# Altium schematic symbol library jlcpcb_2025_04_resistors_extended_0201.schlib: 1508 symbols (part 1 of 8) (continued)
## 0201WMF2672TCE
designator R?  Resistance: 26.7kΩ  (hidden comment: *)
Resistor, 26.7kΩ, ±1%, 50mW, 25V, ±200ppm/℃, -55℃~+155℃, SMD 0201; Manufacturer: Uniroyal; Manufacturer Part Number: 0201WMF2672TCE; Supplier 1: LCSC; Supplier Part Number 1: C270764; JLCPCB Part Number: C270764; Power Rating: 50mW; Category: Resistors; Package Size: 0201; JLCPCB Basic Part: Yes; Tolerance: ±1%; Voltage Rating: 25V; Temperature Coefficient: ±200ppm/℃; Temperature Rating: -55℃~+155℃; ComponentLink1Description: Datasheet; ComponentLink1URL: https://wmsc.lcsc.com/wmsc/upload/file/pdf/v2/lcsc/2205311945_UNI-ROYAL-Uniroyal-Elec-0201WMF2672TCE_C270764.pdf; ComponentLink2Description: JLCPCB Part URL; ComponentLink2URL: https://jlcpcb.com/partdetail/C270764
pins: 1, 2
1 alternate drawing of the same symbol

## 0201WMF2673TEE
designator R?  Resistance: 267000Ω  (hidden comment: *)
Resistor, 267000Ω, ±1%, 50mW, 25V, ±200ppm/℃, -55℃~+155℃, SMD 0201; Manufacturer: Uniroyal; Manufacturer Part Number: 0201WMF2673TEE; Supplier 1: LCSC; Supplier Part Number 1: C423627; JLCPCB Part Number: C423627; Power Rating: 50mW; Category: Resistors; Package Size: 0201; JLCPCB Basic Part: Yes; Tolerance: ±1%; Voltage Rating: 25V; Temperature Coefficient: ±200ppm/℃; Temperature Rating: -55℃~+155℃; ComponentLink1Description: Datasheet; ComponentLink1URL: https://wmsc.lcsc.com/wmsc/upload/file/pdf/v2/lcsc/2205312145_UNI-ROYAL-Uniroyal-Elec-0201WMF2673TEE_C423627.pdf; ComponentLink2Description: JLCPCB Part URL; ComponentLink2URL: https://jlcpcb.com/partdetail/C423627
pins: 1, 2
1 alternate drawing of the same symbol

## 0201WMF2700TEE
designator R?  Resistance: 270Ω  (hidden comment: *)
Resistor, 270Ω, ±1%, 50mW, 25V, ±200ppm/℃, -55℃~+155℃, SMD 0201; Manufacturer: Uniroyal; Manufacturer Part Number: 0201WMF2700TEE; Supplier 1: LCSC; Supplier Part Number 1: C423625; JLCPCB Part Number: C423625; Power Rating: 50mW; Category: Resistors; Package Size: 0201; JLCPCB Basic Part: Yes; Tolerance: ±1%; Voltage Rating: 25V; Temperature Coefficient: ±200ppm/℃; Temperature Rating: -55℃~+155℃; ComponentLink1Description: Datasheet; ComponentLink1URL: https://wmsc.lcsc.com/wmsc/upload/file/pdf/v2/lcsc/2205312030_UNI-ROYAL-Uniroyal-Elec-0201WMF2700TEE_C423625.pdf; ComponentLink2Description: JLCPCB Part URL; ComponentLink2URL: https://jlcpcb.com/partdetail/C423625
pins: 1, 2
1 alternate drawing of the same symbol

## 0201WMF2701TEE
designator R?  Resistance: 2700Ω  (hidden comment: *)
Resistor, 2700Ω, ±1%, 50mW, 25V, ±200ppm/℃, -55℃~+155℃, SMD 0201; Manufacturer: Uniroyal; Manufacturer Part Number: 0201WMF2701TEE; Supplier 1: LCSC; Supplier Part Number 1: C423624; JLCPCB Part Number: C423624; Power Rating: 50mW; Category: Resistors; Package Size: 0201; JLCPCB Basic Part: Yes; Tolerance: ±1%; Voltage Rating: 25V; Temperature Coefficient: ±200ppm/℃; Temperature Rating: -55℃~+155℃; ComponentLink1Description: Datasheet; ComponentLink1URL: https://wmsc.lcsc.com/wmsc/upload/file/pdf/v2/lcsc/2205312145_UNI-ROYAL-Uniroyal-Elec-0201WMF2701TEE_C423624.pdf; ComponentLink2Description: JLCPCB Part URL; ComponentLink2URL: https://jlcpcb.com/partdetail/C423624
pins: 1, 2
1 alternate drawing of the same symbol

## 0201WMF2702TEE
designator R?  Resistance: 27kΩ  (hidden comment: *)
Resistor, 27kΩ, ±1%, 50mW, 25V, ±200ppm/℃, -55℃~+155℃, SMD 0201; Manufacturer: Uniroyal; Manufacturer Part Number: 0201WMF2702TEE; Supplier 1: LCSC; Supplier Part Number 1: C270351; JLCPCB Part Number: C270351; Power Rating: 50mW; Category: Resistors; Package Size: 0201; JLCPCB Basic Part: Yes; Tolerance: ±1%; Voltage Rating: 25V; Temperature Coefficient: ±200ppm/℃; Temperature Rating: -55℃~+155℃; ComponentLink1Description: Datasheet; ComponentLink1URL: https://wmsc.lcsc.com/wmsc/upload/file/pdf/v2/lcsc/2205311945_UNI-ROYAL-Uniroyal-Elec-0201WMF2702TEE_C270351.pdf; ComponentLink2Description: JLCPCB Part URL; ComponentLink2URL: https://jlcpcb.com/partdetail/C270351
pins: 1, 2
1 alternate drawing of the same symbol

## 0201WMF2703TEE
designator R?  Resistance: 270kΩ  (hidden comment: *)
Resistor, 270kΩ, ±1%, 50mW, 25V, ±200ppm/℃, -55℃~+155℃, SMD 0201; Manufacturer: Uniroyal; Manufacturer Part Number: 0201WMF2703TEE; Supplier 1: LCSC; Supplier Part Number 1: C473608; JLCPCB Part Number: C473608; Power Rating: 50mW; Category: Resistors; Package Size: 0201; JLCPCB Basic Part: Yes; Tolerance: ±1%; Voltage Rating: 25V; Temperature Coefficient: ±200ppm/℃; Temperature Rating: -55℃~+155℃; ComponentLink1Description: Datasheet; ComponentLink1URL: https://wmsc.lcsc.com/wmsc/upload/file/pdf/v2/lcsc/2205312130_UNI-ROYAL-Uniroyal-Elec-0201WMF2703TEE_C473608.pdf; ComponentLink2Description: JLCPCB Part URL; ComponentLink2URL: https://jlcpcb.com/partdetail/C473608
pins: 1, 2
1 alternate drawing of the same symbol

## 0201WMF2742TEE
designator R?  Resistance: 27.4kΩ  (hidden comment: *)
Resistor, 27.4kΩ, ±1%, 50mW, 25V, ±200ppm/℃, -55℃~+155℃, SMD 0201; Manufacturer: Uniroyal; Manufacturer Part Number: 0201WMF2742TEE; Supplier 1: LCSC; Supplier Part Number 1: C473648; JLCPCB Part Number: C473648; Power Rating: 50mW; Category: Resistors; Package Size: 0201; JLCPCB Basic Part: Yes; Tolerance: ±1%; Voltage Rating: 25V; Temperature Coefficient: ±200ppm/℃; Temperature Rating: -55℃~+155℃; ComponentLink1Description: Datasheet; ComponentLink1URL: https://wmsc.lcsc.com/wmsc/upload/file/pdf/v2/lcsc/2205312130_UNI-ROYAL-Uniroyal-Elec-0201WMF2742TEE_C473648.pdf; ComponentLink2Description: JLCPCB Part URL; ComponentLink2URL: https://jlcpcb.com/partdetail/C473648
pins: 1, 2
1 alternate drawing of the same symbol

## 0201WMF2743TEE
designator R?  Resistance: 274000Ω  (hidden comment: *)
Resistor, 274000Ω, ±1%, 50mW, 25V, ±200ppm/℃, -55℃~+155℃, SMD 0201; Manufacturer: Uniroyal; Manufacturer Part Number: 0201WMF2743TEE; Supplier 1: LCSC; Supplier Part Number 1: C423622; JLCPCB Part Number: C423622; Power Rating: 50mW; Category: Resistors; Package Size: 0201; JLCPCB Basic Part: Yes; Tolerance: ±1%; Voltage Rating: 25V; Temperature Coefficient: ±200ppm/℃; Temperature Rating: -55℃~+155℃; ComponentLink1Description: Datasheet; ComponentLink1URL: https://wmsc.lcsc.com/wmsc/upload/file/pdf/v2/lcsc/2205312145_UNI-ROYAL-Uniroyal-Elec-0201WMF2743TEE_C423622.pdf; ComponentLink2Description: JLCPCB Part URL; ComponentLink2URL: https://jlcpcb.com/partdetail/C423622
pins: 1, 2
1 alternate drawing of the same symbol

## 0201WMF2802TEE
designator R?  Resistance: 28kΩ  (hidden comment: *)
Resistor, 28kΩ, ±1%, 50mW, 25V, ±200ppm/℃, -55℃~+155℃, SMD 0201; Manufacturer: Uniroyal; Manufacturer Part Number: 0201WMF2802TEE; Supplier 1: LCSC; Supplier Part Number 1: C473489; JLCPCB Part Number: C473489; Power Rating: 50mW; Category: Resistors; Package Size: 0201; JLCPCB Basic Part: Yes; Tolerance: ±1%; Voltage Rating: 25V; Temperature Coefficient: ±200ppm/℃; Temperature Rating: -55℃~+155℃; ComponentLink1Description: Datasheet; ComponentLink1URL: https://wmsc.lcsc.com/wmsc/upload/file/pdf/v2/lcsc/2205312145_UNI-ROYAL-Uniroyal-Elec-0201WMF2802TEE_C473489.pdf; ComponentLink2Description: JLCPCB Part URL; ComponentLink2URL: https://jlcpcb.com/partdetail/C473489
pins: 1, 2
1 alternate drawing of the same symbol

## 0201WMF2871TEE
designator R?  Resistance: 2870Ω  (hidden comment: *)
Resistor, 2870Ω, ±1%, 50mW, 25V, ±200ppm/℃, -55℃~+155℃, SMD 0201; Manufacturer: Uniroyal; Manufacturer Part Number: 0201WMF2871TEE; Supplier 1: LCSC; Supplier Part Number 1: C423613; JLCPCB Part Number: C423613; Power Rating: 50mW; Category: Resistors; Package Size: 0201; JLCPCB Basic Part: Yes; Tolerance: ±1%; Voltage Rating: 25V; Temperature Coefficient: ±200ppm/℃; Temperature Rating: -55℃~+155℃; ComponentLink1Description: Datasheet; ComponentLink1URL: https://wmsc.lcsc.com/wmsc/upload/file/pdf/v2/lcsc/2205312145_UNI-ROYAL-Uniroyal-Elec-0201WMF2871TEE_C423613.pdf; ComponentLink2Description: JLCPCB Part URL; ComponentLink2URL: https://jlcpcb.com/partdetail/C423613
pins: 1, 2
1 alternate drawing of the same symbol

## 0201WMF2873TCE
designator R?  Resistance: 287kΩ  (hidden comment: *)
Resistor, 287kΩ, ±1%, 50mW, 25V, ±200ppm/℃, -55℃~+155℃, SMD 0201; Manufacturer: Uniroyal; Manufacturer Part Number: 0201WMF2873TCE; Supplier 1: LCSC; Supplier Part Number 1: C270758; JLCPCB Part Number: C270758; Power Rating: 50mW; Category: Resistors; Package Size: 0201; JLCPCB Basic Part: Yes; Tolerance: ±1%; Voltage Rating: 25V; Temperature Coefficient: ±200ppm/℃; Temperature Rating: -55℃~+155℃; ComponentLink1Description: Datasheet; ComponentLink1URL: https://wmsc.lcsc.com/wmsc/upload/file/pdf/v2/lcsc/2205311945_UNI-ROYAL-Uniroyal-Elec-0201WMF2873TCE_C270758.pdf; ComponentLink2Description: JLCPCB Part URL; ComponentLink2URL: https://jlcpcb.com/partdetail/C270758
pins: 1, 2
1 alternate drawing of the same symbol

## 0201WMF2941TCE
designator R?  Resistance: 2.94kΩ  (hidden comment: *)
Resistor, 2.94kΩ, ±1%, 50mW, 25V, ±200ppm/℃, -55℃~+155℃, SMD 0201; Manufacturer: Uniroyal; Manufacturer Part Number: 0201WMF2941TCE; Supplier 1: LCSC; Supplier Part Number 1: C270757; JLCPCB Part Number: C270757; Power Rating: 50mW; Category: Resistors; Package Size: 0201; JLCPCB Basic Part: Yes; Tolerance: ±1%; Voltage Rating: 25V; Temperature Coefficient: ±200ppm/℃; Temperature Rating: -55℃~+155℃; ComponentLink1Description: Datasheet; ComponentLink1URL: https://wmsc.lcsc.com/wmsc/upload/file/pdf/v2/lcsc/2205311945_UNI-ROYAL-Uniroyal-Elec-0201WMF2941TCE_C270757.pdf; ComponentLink2Description: JLCPCB Part URL; ComponentLink2URL: https://jlcpcb.com/partdetail/C270757
pins: 1, 2
1 alternate drawing of the same symbol

## 0201WMF3001TEE
designator R?  Resistance: 3kΩ  (hidden comment: *)
Resistor, 3kΩ, ±1%, 50mW, 25V, ±200ppm/℃, -55℃~+155℃, SMD 0201; Manufacturer: Uniroyal; Manufacturer Part Number: 0201WMF3001TEE; Supplier 1: LCSC; Supplier Part Number 1: C473468; JLCPCB Part Number: C473468; Power Rating: 50mW; Category: Resistors; Package Size: 0201; JLCPCB Basic Part: Yes; Tolerance: ±1%; Voltage Rating: 25V; Temperature Coefficient: ±200ppm/℃; Temperature Rating: -55℃~+155℃; ComponentLink1Description: Datasheet; ComponentLink1URL: https://wmsc.lcsc.com/wmsc/upload/file/pdf/v2/lcsc/2205312145_UNI-ROYAL-Uniroyal-Elec-0201WMF3001TEE_C473468.pdf; ComponentLink2Description: JLCPCB Part URL; ComponentLink2URL: https://jlcpcb.com/partdetail/C473468
pins: 1, 2
1 alternate drawing of the same symbol

## 0201WMF3002TEE
designator R?  Resistance: 30kΩ  (hidden comment: *)
Resistor, 30kΩ, ±1%, 50mW, 25V, ±200ppm/℃, -55℃~+155℃, SMD 0201; Manufacturer: Uniroyal; Manufacturer Part Number: 0201WMF3002TEE; Supplier 1: LCSC; Supplier Part Number 1: C246933; JLCPCB Part Number: C246933; Power Rating: 50mW; Category: Resistors; Package Size: 0201; JLCPCB Basic Part: Yes; Tolerance: ±1%; Voltage Rating: 25V; Temperature Coefficient: ±200ppm/℃; Temperature Rating: -55℃~+155℃; ComponentLink1Description: Datasheet; ComponentLink1URL: https://wmsc.lcsc.com/wmsc/upload/file/pdf/v2/lcsc/2205311916_UNI-ROYAL-Uniroyal-Elec-0201WMF3002TEE_C246933.pdf; ComponentLink2Description: JLCPCB Part URL; ComponentLink2URL: https://jlcpcb.com/partdetail/C246933
pins: 1, 2
1 alternate drawing of the same symbol

## 0201WMF3003TEE
designator R?  Resistance: 300kΩ  (hidden comment: *)
Resistor, 300kΩ, ±1%, 50mW, 25V, ±200ppm/℃, -55℃~+155℃, SMD 0201; Manufacturer: Uniroyal; Manufacturer Part Number: 0201WMF3003TEE; Supplier 1: LCSC; Supplier Part Number 1: C473494; JLCPCB Part Number: C473494; Power Rating: 50mW; Category: Resistors; Package Size: 0201; JLCPCB Basic Part: Yes; Tolerance: ±1%; Voltage Rating: 25V; Temperature Coefficient: ±200ppm/℃; Temperature Rating: -55℃~+155℃; ComponentLink1Description: Datasheet; ComponentLink1URL: https://wmsc.lcsc.com/wmsc/upload/file/pdf/v2/lcsc/2205312030_UNI-ROYAL-Uniroyal-Elec-0201WMF3003TEE_C473494.pdf; ComponentLink2Description: JLCPCB Part URL; ComponentLink2URL: https://jlcpcb.com/partdetail/C473494
pins: 1, 2
1 alternate drawing of the same symbol

## 0201WMF3004TEE
designator R?  Resistance: 3MΩ  (hidden comment: *)
Resistor, 3MΩ, ±1%, 50mW, 25V, ±200ppm/℃, -55℃~+155℃, SMD 0201; Manufacturer: Uniroyal; Manufacturer Part Number: 0201WMF3004TEE; Supplier 1: LCSC; Supplier Part Number 1: C423601; JLCPCB Part Number: C423601; Power Rating: 50mW; Category: Resistors; Package Size: 0201; JLCPCB Basic Part: Yes; Tolerance: ±1%; Voltage Rating: 25V; Temperature Coefficient: ±200ppm/℃; Temperature Rating: -55℃~+155℃; ComponentLink1Description: Datasheet; ComponentLink1URL: https://wmsc.lcsc.com/wmsc/upload/file/pdf/v2/lcsc/2205312145_UNI-ROYAL-Uniroyal-Elec-0201WMF3004TEE_C423601.pdf; ComponentLink2Description: JLCPCB Part URL; ComponentLink2URL: https://jlcpcb.com/partdetail/C423601
pins: 1, 2
1 alternate drawing of the same symbol

## 0201WMF3010TEE
designator R?  Resistance: 301Ω  (hidden comment: *)
Resistor, 301Ω, ±1%, 50mW, 25V, ±200ppm/℃, -55℃~+155℃, SMD 0201; Manufacturer: Uniroyal; Manufacturer Part Number: 0201WMF3010TEE; Supplier 1: LCSC; Supplier Part Number 1: C473531; JLCPCB Part Number: C473531; Power Rating: 50mW; Category: Resistors; Package Size: 0201; JLCPCB Basic Part: Yes; Tolerance: ±1%; Voltage Rating: 25V; Temperature Coefficient: ±200ppm/℃; Temperature Rating: -55℃~+155℃; ComponentLink1Description: Datasheet; ComponentLink1URL: https://wmsc.lcsc.com/wmsc/upload/file/pdf/v2/lcsc/2205312145_UNI-ROYAL-Uniroyal-Elec-0201WMF3010TEE_C473531.pdf; ComponentLink2Description: JLCPCB Part URL; ComponentLink2URL: https://jlcpcb.com/partdetail/C473531
pins: 1, 2
1 alternate drawing of the same symbol

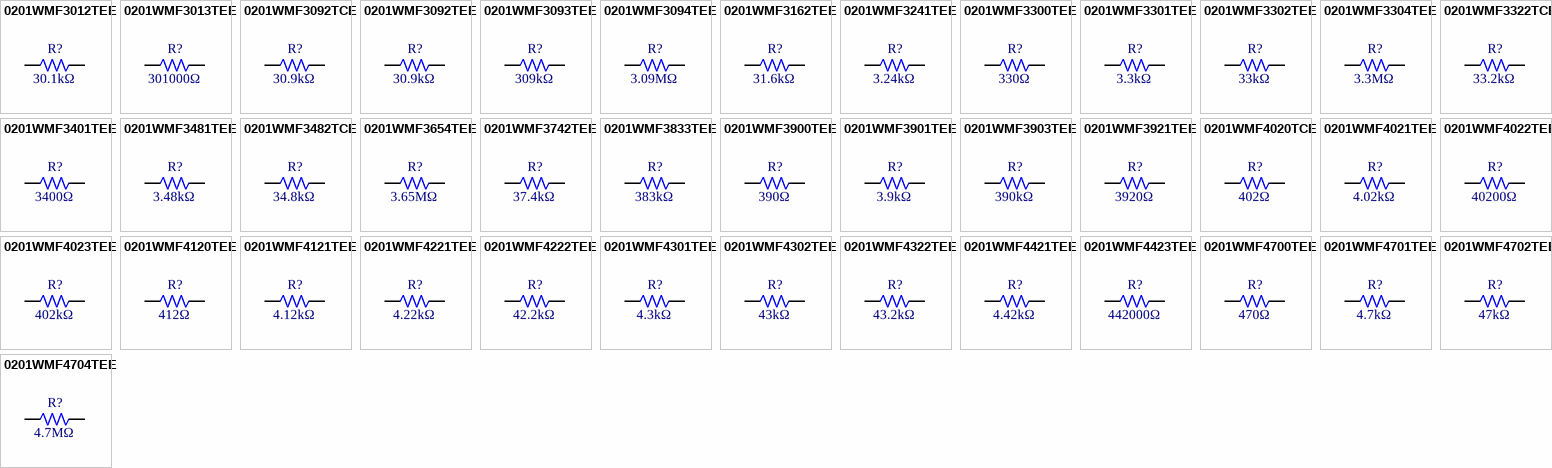
[diagram p4: symbols 0201WMF3012TEE to 0201WMF4704TEE]

## 0201WMF3012TEE
designator R?  Resistance: 30.1kΩ  (hidden comment: *)
Resistor, 30.1kΩ, ±1%, 50mW, 25V, ±200ppm/℃, -55℃~+155℃, SMD 0201; Manufacturer: Uniroyal; Manufacturer Part Number: 0201WMF3012TEE; Supplier 1: LCSC; Supplier Part Number 1: C778420; JLCPCB Part Number: C778420; Power Rating: 50mW; Category: Resistors; Package Size: 0201; JLCPCB Basic Part: Yes; Tolerance: ±1%; Voltage Rating: 25V; Temperature Coefficient: ±200ppm/℃; Temperature Rating: -55℃~+155℃; ComponentLink1Description: Datasheet; ComponentLink1URL: https://wmsc.lcsc.com/wmsc/upload/file/pdf/v2/lcsc/2205312045_UNI-ROYAL-Uniroyal-Elec-0201WMF3012TEE_C778420.pdf; ComponentLink2Description: JLCPCB Part URL; ComponentLink2URL: https://jlcpcb.com/partdetail/C778420
pins: 1, 2
1 alternate drawing of the same symbol

## 0201WMF3013TEE
designator R?  Resistance: 301000Ω  (hidden comment: *)
Resistor, 301000Ω, ±1%, 50mW, 25V, ±200ppm/℃, -55℃~+155℃, SMD 0201; Manufacturer: Uniroyal; Manufacturer Part Number: 0201WMF3013TEE; Supplier 1: LCSC; Supplier Part Number 1: C423598; JLCPCB Part Number: C423598; Power Rating: 50mW; Category: Resistors; Package Size: 0201; JLCPCB Basic Part: Yes; Tolerance: ±1%; Voltage Rating: 25V; Temperature Coefficient: ±200ppm/℃; Temperature Rating: -55℃~+155℃; ComponentLink1Description: Datasheet; ComponentLink1URL: https://wmsc.lcsc.com/wmsc/upload/file/pdf/v2/lcsc/2206011100_UNI-ROYAL-Uniroyal-Elec-0201WMF3013TEE_C423598.pdf; ComponentLink2Description: JLCPCB Part URL; ComponentLink2URL: https://jlcpcb.com/partdetail/C423598
pins: 1, 2
1 alternate drawing of the same symbol

## 0201WMF3092TCE
designator R?  Resistance: 30.9kΩ  (hidden comment: *)
Resistor, 30.9kΩ, ±1%, 50mW, 25V, ±200ppm/℃, -55℃~+155℃, SMD 0201; Manufacturer: Uniroyal; Manufacturer Part Number: 0201WMF3092TCE; Supplier 1: LCSC; Supplier Part Number 1: C270751; JLCPCB Part Number: C270751; Power Rating: 50mW; Category: Resistors; Package Size: 0201; JLCPCB Basic Part: Yes; Tolerance: ±1%; Voltage Rating: 25V; Temperature Coefficient: ±200ppm/℃; Temperature Rating: -55℃~+155℃; ComponentLink1Description: Datasheet; ComponentLink1URL: https://wmsc.lcsc.com/wmsc/upload/file/pdf/v2/lcsc/2205311945_UNI-ROYAL-Uniroyal-Elec-0201WMF3092TCE_C270751.pdf; ComponentLink2Description: JLCPCB Part URL; ComponentLink2URL: https://jlcpcb.com/partdetail/C270751
pins: 1, 2
1 alternate drawing of the same symbol

## 0201WMF3092TEE
designator R?  Resistance: 30.9kΩ  (hidden comment: *)
Resistor, 30.9kΩ, ±1%, 50mW, 25V, ±200ppm/℃, -55℃~+155℃, SMD 0201; Manufacturer: Uniroyal; Manufacturer Part Number: 0201WMF3092TEE; Supplier 1: LCSC; Supplier Part Number 1: C473585; JLCPCB Part Number: C473585; Power Rating: 50mW; Category: Resistors; Package Size: 0201; JLCPCB Basic Part: Yes; Tolerance: ±1%; Voltage Rating: 25V; Temperature Coefficient: ±200ppm/℃; Temperature Rating: -55℃~+155℃; ComponentLink1Description: Datasheet; ComponentLink1URL: https://wmsc.lcsc.com/wmsc/upload/file/pdf/v2/lcsc/2205312145_UNI-ROYAL-Uniroyal-Elec-0201WMF3092TEE_C473585.pdf; ComponentLink2Description: JLCPCB Part URL; ComponentLink2URL: https://jlcpcb.com/partdetail/C473585
pins: 1, 2
1 alternate drawing of the same symbol

## 0201WMF3093TEE
designator R?  Resistance: 309kΩ  (hidden comment: *)
Resistor, 309kΩ, ±1%, 50mW, 25V, ±200ppm/℃, -55℃~+155℃, SMD 0201; Manufacturer: Uniroyal; Manufacturer Part Number: 0201WMF3093TEE; Supplier 1: LCSC; Supplier Part Number 1: C423593; JLCPCB Part Number: C423593; Power Rating: 50mW; Category: Resistors; Package Size: 0201; JLCPCB Basic Part: Yes; Tolerance: ±1%; Voltage Rating: 25V; Temperature Coefficient: ±200ppm/℃; Temperature Rating: -55℃~+155℃; ComponentLink1Description: Datasheet; ComponentLink1URL: https://wmsc.lcsc.com/wmsc/upload/file/pdf/v2/lcsc/2205312030_UNI-ROYAL-Uniroyal-Elec-0201WMF3093TEE_C423593.pdf; ComponentLink2Description: JLCPCB Part URL; ComponentLink2URL: https://jlcpcb.com/partdetail/C423593
pins: 1, 2
1 alternate drawing of the same symbol

## 0201WMF3094TEE
designator R?  Resistance: 3.09MΩ  (hidden comment: *)
Resistor, 3.09MΩ, ±1%, 50mW, 25V, ±200ppm/℃, -55℃~+155℃, SMD 0201; Manufacturer: Uniroyal; Manufacturer Part Number: 0201WMF3094TEE; Supplier 1: LCSC; Supplier Part Number 1: C423592; JLCPCB Part Number: C423592; Power Rating: 50mW; Category: Resistors; Package Size: 0201; JLCPCB Basic Part: Yes; Tolerance: ±1%; Voltage Rating: 25V; Temperature Coefficient: ±200ppm/℃; Temperature Rating: -55℃~+155℃; ComponentLink1Description: Datasheet; ComponentLink1URL: https://wmsc.lcsc.com/wmsc/upload/file/pdf/v2/lcsc/2205312145_UNI-ROYAL-Uniroyal-Elec-0201WMF3094TEE_C423592.pdf; ComponentLink2Description: JLCPCB Part URL; ComponentLink2URL: https://jlcpcb.com/partdetail/C423592
pins: 1, 2
1 alternate drawing of the same symbol

## 0201WMF3162TEE
designator R?  Resistance: 31.6kΩ  (hidden comment: *)
Resistor, 31.6kΩ, ±1%, 50mW, 25V, ±200ppm/℃, -55℃~+155℃, SMD 0201; Manufacturer: Uniroyal; Manufacturer Part Number: 0201WMF3162TEE; Supplier 1: LCSC; Supplier Part Number 1: C474108; JLCPCB Part Number: C474108; Power Rating: 50mW; Category: Resistors; Package Size: 0201; JLCPCB Basic Part: Yes; Tolerance: ±1%; Voltage Rating: 25V; Temperature Coefficient: ±200ppm/℃; Temperature Rating: -55℃~+155℃; ComponentLink1Description: Datasheet; ComponentLink1URL: https://wmsc.lcsc.com/wmsc/upload/file/pdf/v2/lcsc/2205312130_UNI-ROYAL-Uniroyal-Elec-0201WMF3162TEE_C474108.pdf; ComponentLink2Description: JLCPCB Part URL; ComponentLink2URL: https://jlcpcb.com/partdetail/C474108
pins: 1, 2
1 alternate drawing of the same symbol

## 0201WMF3241TEE
designator R?  Resistance: 3.24kΩ  (hidden comment: *)
Resistor, 3.24kΩ, ±1%, 50mW, 25V, ±200ppm/℃, -55℃~+155℃, SMD 0201; Manufacturer: Uniroyal; Manufacturer Part Number: 0201WMF3241TEE; Supplier 1: LCSC; Supplier Part Number 1: C2691588; JLCPCB Part Number: C2691588; Power Rating: 50mW; Category: Resistors; Package Size: 0201; JLCPCB Basic Part: Yes; Tolerance: ±1%; Voltage Rating: 25V; Temperature Coefficient: ±200ppm/℃; Temperature Rating: -55℃~+155℃; ComponentLink1Description: Datasheet; ComponentLink1URL: https://wmsc.lcsc.com/wmsc/upload/file/pdf/v2/lcsc/2205312045_UNI-ROYAL-Uniroyal-Elec-0201WMF3241TEE_C2691588.pdf; ComponentLink2Description: JLCPCB Part URL; ComponentLink2URL: https://jlcpcb.com/partdetail/C2691588
pins: 1, 2
1 alternate drawing of the same symbol

## 0201WMF3300TEE
designator R?  Resistance: 330Ω  (hidden comment: *)
Resistor, 330Ω, ±1%, 50mW, 25V, ±200ppm/℃, -55℃~+155℃, SMD 0201; Manufacturer: Uniroyal; Manufacturer Part Number: 0201WMF3300TEE; Supplier 1: LCSC; Supplier Part Number 1: C516485; JLCPCB Part Number: C516485; Power Rating: 50mW; Category: Resistors; Package Size: 0201; JLCPCB Basic Part: Yes; Tolerance: ±1%; Voltage Rating: 25V; Temperature Coefficient: ±200ppm/℃; Temperature Rating: -55℃~+155℃; ComponentLink1Description: Datasheet; ComponentLink1URL: https://wmsc.lcsc.com/wmsc/upload/file/pdf/v2/lcsc/2205312045_UNI-ROYAL-Uniroyal-Elec-0201WMF3300TEE_C516485.pdf; ComponentLink2Description: JLCPCB Part URL; ComponentLink2URL: https://jlcpcb.com/partdetail/C516485
pins: 1, 2
1 alternate drawing of the same symbol

## 0201WMF3301TEE
designator R?  Resistance: 3.3kΩ  (hidden comment: *)
Resistor, 3.3kΩ, ±1%, 50mW, 25V, ±200ppm/℃, -55℃~+155℃, SMD 0201; Manufacturer: Uniroyal; Manufacturer Part Number: 0201WMF3301TEE; Supplier 1: LCSC; Supplier Part Number 1: C270350; JLCPCB Part Number: C270350; Power Rating: 50mW; Category: Resistors; Package Size: 0201; JLCPCB Basic Part: Yes; Tolerance: ±1%; Voltage Rating: 25V; Temperature Coefficient: ±200ppm/℃; Temperature Rating: -55℃~+155℃; ComponentLink1Description: Datasheet; ComponentLink1URL: https://wmsc.lcsc.com/wmsc/upload/file/pdf/v2/lcsc/2205311945_UNI-ROYAL-Uniroyal-Elec-0201WMF3301TEE_C270350.pdf; ComponentLink2Description: JLCPCB Part URL; ComponentLink2URL: https://jlcpcb.com/partdetail/C270350
pins: 1, 2
1 alternate drawing of the same symbol

## 0201WMF3302TEE
designator R?  Resistance: 33kΩ  (hidden comment: *)
Resistor, 33kΩ, ±1%, 50mW, 25V, ±200ppm/℃, -55℃~+155℃, SMD 0201; Manufacturer: Uniroyal; Manufacturer Part Number: 0201WMF3302TEE; Supplier 1: LCSC; Supplier Part Number 1: C473534; JLCPCB Part Number: C473534; Power Rating: 50mW; Category: Resistors; Package Size: 0201; JLCPCB Basic Part: Yes; Tolerance: ±1%; Voltage Rating: 25V; Temperature Coefficient: ±200ppm/℃; Temperature Rating: -55℃~+155℃; ComponentLink1Description: Datasheet; ComponentLink1URL: https://wmsc.lcsc.com/wmsc/upload/file/pdf/v2/lcsc/2205312145_UNI-ROYAL-Uniroyal-Elec-0201WMF3302TEE_C473534.pdf; ComponentLink2Description: JLCPCB Part URL; ComponentLink2URL: https://jlcpcb.com/partdetail/C473534
pins: 1, 2
1 alternate drawing of the same symbol

## 0201WMF3304TEE
designator R?  Resistance: 3.3MΩ  (hidden comment: *)
Resistor, 3.3MΩ, ±1%, 50mW, 25V, ±200ppm/℃, -55℃~+155℃, SMD 0201; Manufacturer: Uniroyal; Manufacturer Part Number: 0201WMF3304TEE; Supplier 1: LCSC; Supplier Part Number 1: C423582; JLCPCB Part Number: C423582; Power Rating: 50mW; Category: Resistors; Package Size: 0201; JLCPCB Basic Part: Yes; Tolerance: ±1%; Voltage Rating: 25V; Temperature Coefficient: ±200ppm/℃; Temperature Rating: -55℃~+155℃; ComponentLink1Description: Datasheet; ComponentLink1URL: https://wmsc.lcsc.com/wmsc/upload/file/pdf/v2/lcsc/2205312145_UNI-ROYAL-Uniroyal-Elec-0201WMF3304TEE_C423582.pdf; ComponentLink2Description: JLCPCB Part URL; ComponentLink2URL: https://jlcpcb.com/partdetail/C423582
pins: 1, 2
1 alternate drawing of the same symbol

## 0201WMF3322TCE
designator R?  Resistance: 33.2kΩ  (hidden comment: *)
Resistor, 33.2kΩ, ±1%, 50mW, 25V, ±200ppm/℃, -55℃~+155℃, SMD 0201; Manufacturer: Uniroyal; Manufacturer Part Number: 0201WMF3322TCE; Supplier 1: LCSC; Supplier Part Number 1: C246930; JLCPCB Part Number: C246930; Power Rating: 50mW; Category: Resistors; Package Size: 0201; JLCPCB Basic Part: Yes; Tolerance: ±1%; Voltage Rating: 25V; Temperature Coefficient: ±200ppm/℃; Temperature Rating: -55℃~+155℃; ComponentLink1Description: Datasheet; ComponentLink1URL: https://wmsc.lcsc.com/wmsc/upload/file/pdf/v2/lcsc/2205311916_UNI-ROYAL-Uniroyal-Elec-0201WMF3322TCE_C246930.pdf; ComponentLink2Description: JLCPCB Part URL; ComponentLink2URL: https://jlcpcb.com/partdetail/C246930
pins: 1, 2
1 alternate drawing of the same symbol

## 0201WMF3401TEE
designator R?  Resistance: 3400Ω  (hidden comment: *)
Resistor, 3400Ω, ±1%, 50mW, 25V, ±200ppm/℃, -55℃~+155℃, SMD 0201; Manufacturer: Uniroyal; Manufacturer Part Number: 0201WMF3401TEE; Supplier 1: LCSC; Supplier Part Number 1: C423574; JLCPCB Part Number: C423574; Power Rating: 50mW; Category: Resistors; Package Size: 0201; JLCPCB Basic Part: Yes; Tolerance: ±1%; Voltage Rating: 25V; Temperature Coefficient: ±200ppm/℃; Temperature Rating: -55℃~+155℃; ComponentLink1Description: Datasheet; ComponentLink1URL: https://wmsc.lcsc.com/wmsc/upload/file/pdf/v2/lcsc/2205312145_UNI-ROYAL-Uniroyal-Elec-0201WMF3401TEE_C423574.pdf; ComponentLink2Description: JLCPCB Part URL; ComponentLink2URL: https://jlcpcb.com/partdetail/C423574
pins: 1, 2
1 alternate drawing of the same symbol

## 0201WMF3481TEE
designator R?  Resistance: 3.48kΩ  (hidden comment: *)
Resistor, 3.48kΩ, ±1%, 50mW, 25V, ±200ppm/℃, -55℃~+155℃, SMD 0201; Manufacturer: Uniroyal; Manufacturer Part Number: 0201WMF3481TEE; Supplier 1: LCSC; Supplier Part Number 1: C784147; JLCPCB Part Number: C784147; Power Rating: 50mW; Category: Resistors; Package Size: 0201; JLCPCB Basic Part: Yes; Tolerance: ±1%; Voltage Rating: 25V; Temperature Coefficient: ±200ppm/℃; Temperature Rating: -55℃~+155℃; ComponentLink1Description: Datasheet; ComponentLink1URL: https://wmsc.lcsc.com/wmsc/upload/file/pdf/v2/lcsc/2205312030_UNI-ROYAL-Uniroyal-Elec-0201WMF3481TEE_C784147.pdf; ComponentLink2Description: JLCPCB Part URL; ComponentLink2URL: https://jlcpcb.com/partdetail/C784147
pins: 1, 2
1 alternate drawing of the same symbol

## 0201WMF3482TCE
designator R?  Resistance: 34.8kΩ  (hidden comment: *)
Resistor, 34.8kΩ, ±1%, 50mW, 25V, ±200ppm/℃, -55℃~+155℃, SMD 0201; Manufacturer: Uniroyal; Manufacturer Part Number: 0201WMF3482TCE; Supplier 1: LCSC; Supplier Part Number 1: C270743; JLCPCB Part Number: C270743; Power Rating: 50mW; Category: Resistors; Package Size: 0201; JLCPCB Basic Part: Yes; Tolerance: ±1%; Voltage Rating: 25V; Temperature Coefficient: ±200ppm/℃; Temperature Rating: -55℃~+155℃; ComponentLink1Description: Datasheet; ComponentLink1URL: https://wmsc.lcsc.com/wmsc/upload/file/pdf/v2/lcsc/2205311945_UNI-ROYAL-Uniroyal-Elec-0201WMF3482TCE_C270743.pdf; ComponentLink2Description: JLCPCB Part URL; ComponentLink2URL: https://jlcpcb.com/partdetail/C270743
pins: 1, 2
1 alternate drawing of the same symbol

## 0201WMF3654TEE
designator R?  Resistance: 3.65MΩ  (hidden comment: *)
Resistor, 3.65MΩ, ±1%, 50mW, 25V, ±200ppm/℃, -55℃~+155℃, SMD 0201; Manufacturer: Uniroyal; Manufacturer Part Number: 0201WMF3654TEE; Supplier 1: LCSC; Supplier Part Number 1: C423556; JLCPCB Part Number: C423556; Power Rating: 50mW; Category: Resistors; Package Size: 0201; JLCPCB Basic Part: Yes; Tolerance: ±1%; Voltage Rating: 25V; Temperature Coefficient: ±200ppm/℃; Temperature Rating: -55℃~+155℃; ComponentLink1Description: Datasheet; ComponentLink1URL: https://wmsc.lcsc.com/wmsc/upload/file/pdf/v2/lcsc/2205312145_UNI-ROYAL-Uniroyal-Elec-0201WMF3654TEE_C423556.pdf; ComponentLink2Description: JLCPCB Part URL; ComponentLink2URL: https://jlcpcb.com/partdetail/C423556
pins: 1, 2
1 alternate drawing of the same symbol

## 0201WMF3742TEE
designator R?  Resistance: 37.4kΩ  (hidden comment: *)
Resistor, 37.4kΩ, ±1%, 50mW, 25V, ±200ppm/℃, -55℃~+155℃, SMD 0201; Manufacturer: Uniroyal; Manufacturer Part Number: 0201WMF3742TEE; Supplier 1: LCSC; Supplier Part Number 1: C473644; JLCPCB Part Number: C473644; Power Rating: 50mW; Category: Resistors; Package Size: 0201; JLCPCB Basic Part: Yes; Tolerance: ±1%; Voltage Rating: 25V; Temperature Coefficient: ±200ppm/℃; Temperature Rating: -55℃~+155℃; ComponentLink1Description: Datasheet; ComponentLink1URL: https://wmsc.lcsc.com/wmsc/upload/file/pdf/v2/lcsc/2205312130_UNI-ROYAL-Uniroyal-Elec-0201WMF3742TEE_C473644.pdf; ComponentLink2Description: JLCPCB Part URL; ComponentLink2URL: https://jlcpcb.com/partdetail/C473644
pins: 1, 2
1 alternate drawing of the same symbol

## 0201WMF3833TEE
designator R?  Resistance: 383kΩ  (hidden comment: *)
Resistor, 383kΩ, ±1%, 50mW, 25V, ±200ppm/℃, -55℃~+155℃, SMD 0201; Manufacturer: Uniroyal; Manufacturer Part Number: 0201WMF3833TEE; Supplier 1: LCSC; Supplier Part Number 1: C423549; JLCPCB Part Number: C423549; Power Rating: 50mW; Category: Resistors; Package Size: 0201; JLCPCB Basic Part: Yes; Tolerance: ±1%; Voltage Rating: 25V; Temperature Coefficient: ±200ppm/℃; Temperature Rating: -55℃~+155℃; ComponentLink1Description: Datasheet; ComponentLink1URL: https://wmsc.lcsc.com/wmsc/upload/file/pdf/v2/lcsc/2205312145_UNI-ROYAL-Uniroyal-Elec-0201WMF3833TEE_C423549.pdf; ComponentLink2Description: JLCPCB Part URL; ComponentLink2URL: https://jlcpcb.com/partdetail/C423549
pins: 1, 2
1 alternate drawing of the same symbol

## 0201WMF3900TEE
designator R?  Resistance: 390Ω  (hidden comment: *)
Resistor, 390Ω, ±1%, 50mW, 25V, -55℃~+155℃, SMD 0201; Manufacturer: Uniroyal; Manufacturer Part Number: 0201WMF3900TEE; Supplier 1: LCSC; Supplier Part Number 1: C423546; JLCPCB Part Number: C423546; Power Rating: 50mW; Category: Resistors; Package Size: 0201; JLCPCB Basic Part: Yes; Tolerance: ±1%; Voltage Rating: 25V; Temperature Rating: -55℃~+155℃; ComponentLink1Description: Datasheet; ComponentLink1URL: https://wmsc.lcsc.com/wmsc/upload/file/pdf/v2/lcsc/2205312145_UNI-ROYAL-Uniroyal-Elec-0201WMF3900TEE_C423546.pdf; ComponentLink2Description: JLCPCB Part URL; ComponentLink2URL: https://jlcpcb.com/partdetail/C423546
pins: 1, 2
1 alternate drawing of the same symbol

## 0201WMF3901TEE
designator R?  Resistance: 3.9kΩ  (hidden comment: *)
Resistor, 3.9kΩ, ±1%, 50mW, 25V, ±200ppm/℃, -55℃~+155℃, SMD 0201; Manufacturer: Uniroyal; Manufacturer Part Number: 0201WMF3901TEE; Supplier 1: LCSC; Supplier Part Number 1: C473550; JLCPCB Part Number: C473550; Power Rating: 50mW; Category: Resistors; Package Size: 0201; JLCPCB Basic Part: Yes; Tolerance: ±1%; Voltage Rating: 25V; Temperature Coefficient: ±200ppm/℃; Temperature Rating: -55℃~+155℃; ComponentLink1Description: Datasheet; ComponentLink1URL: https://wmsc.lcsc.com/wmsc/upload/file/pdf/v2/lcsc/2205312145_UNI-ROYAL-Uniroyal-Elec-0201WMF3901TEE_C473550.pdf; ComponentLink2Description: JLCPCB Part URL; ComponentLink2URL: https://jlcpcb.com/partdetail/C473550
pins: 1, 2
1 alternate drawing of the same symbol

## 0201WMF3903TEE
designator R?  Resistance: 390kΩ  (hidden comment: *)
Resistor, 390kΩ, ±1%, 50mW, 25V, ±200ppm/℃, -55℃~+155℃, SMD 0201; Manufacturer: Uniroyal; Manufacturer Part Number: 0201WMF3903TEE; Supplier 1: LCSC; Supplier Part Number 1: C270348; JLCPCB Part Number: C270348; Power Rating: 50mW; Category: Resistors; Package Size: 0201; JLCPCB Basic Part: Yes; Tolerance: ±1%; Voltage Rating: 25V; Temperature Coefficient: ±200ppm/℃; Temperature Rating: -55℃~+155℃; ComponentLink1Description: Datasheet; ComponentLink1URL: https://wmsc.lcsc.com/wmsc/upload/file/pdf/v2/lcsc/2205311945_UNI-ROYAL-Uniroyal-Elec-0201WMF3903TEE_C270348.pdf; ComponentLink2Description: JLCPCB Part URL; ComponentLink2URL: https://jlcpcb.com/partdetail/C270348
pins: 1, 2
1 alternate drawing of the same symbol

## 0201WMF3921TEE
designator R?  Resistance: 3920Ω  (hidden comment: *)
Resistor, 3920Ω, ±1%, 50mW, 25V, -55℃~+155℃, SMD 0201; Manufacturer: Uniroyal; Manufacturer Part Number: 0201WMF3921TEE; Supplier 1: LCSC; Supplier Part Number 1: C423542; JLCPCB Part Number: C423542; Power Rating: 50mW; Category: Resistors; Package Size: 0201; JLCPCB Basic Part: Yes; Tolerance: ±1%; Voltage Rating: 25V; Temperature Rating: -55℃~+155℃; ComponentLink1Description: Datasheet; ComponentLink1URL: https://wmsc.lcsc.com/wmsc/upload/file/pdf/v2/lcsc/2207141800_UNI-ROYAL-Uniroyal-Elec-0201WMF3921TEE_C423542.pdf; ComponentLink2Description: JLCPCB Part URL; ComponentLink2URL: https://jlcpcb.com/partdetail/C423542
pins: 1, 2
1 alternate drawing of the same symbol

## 0201WMF4020TCE
designator R?  Resistance: 402Ω  (hidden comment: *)
Resistor, 402Ω, ±1%, 50mW, 25V, ±200ppm/℃, -55℃~+155℃, SMD 0201; Manufacturer: Uniroyal; Manufacturer Part Number: 0201WMF4020TCE; Supplier 1: LCSC; Supplier Part Number 1: C246917; JLCPCB Part Number: C246917; Power Rating: 50mW; Category: Resistors; Package Size: 0201; JLCPCB Basic Part: Yes; Tolerance: ±1%; Voltage Rating: 25V; Temperature Coefficient: ±200ppm/℃; Temperature Rating: -55℃~+155℃; ComponentLink1Description: Datasheet; ComponentLink1URL: https://wmsc.lcsc.com/wmsc/upload/file/pdf/v2/lcsc/2205311916_UNI-ROYAL-Uniroyal-Elec-0201WMF4020TCE_C246917.pdf; ComponentLink2Description: JLCPCB Part URL; ComponentLink2URL: https://jlcpcb.com/partdetail/C246917
pins: 1, 2
1 alternate drawing of the same symbol

## 0201WMF4021TEE
designator R?  Resistance: 4.02kΩ  (hidden comment: *)
Resistor, 4.02kΩ, ±1%, 50mW, 25V, ±200ppm/℃, -55℃~+155℃, SMD 0201; Manufacturer: Uniroyal; Manufacturer Part Number: 0201WMF4021TEE; Supplier 1: LCSC; Supplier Part Number 1: C270347; JLCPCB Part Number: C270347; Power Rating: 50mW; Category: Resistors; Package Size: 0201; JLCPCB Basic Part: Yes; Tolerance: ±1%; Voltage Rating: 25V; Temperature Coefficient: ±200ppm/℃; Temperature Rating: -55℃~+155℃; ComponentLink1Description: Datasheet; ComponentLink1URL: https://wmsc.lcsc.com/wmsc/upload/file/pdf/v2/lcsc/2205311945_UNI-ROYAL-Uniroyal-Elec-0201WMF4021TEE_C270347.pdf; ComponentLink2Description: JLCPCB Part URL; ComponentLink2URL: https://jlcpcb.com/partdetail/C270347
pins: 1, 2
1 alternate drawing of the same symbol

## 0201WMF4022TEE
designator R?  Resistance: 40200Ω  (hidden comment: *)
Resistor, 40200Ω, ±1%, 50mW, 25V, ±200ppm/℃, -55℃~+155℃, SMD 0201; Manufacturer: Uniroyal; Manufacturer Part Number: 0201WMF4022TEE; Supplier 1: LCSC; Supplier Part Number 1: C423536; JLCPCB Part Number: C423536; Power Rating: 50mW; Category: Resistors; Package Size: 0201; JLCPCB Basic Part: Yes; Tolerance: ±1%; Voltage Rating: 25V; Temperature Coefficient: ±200ppm/℃; Temperature Rating: -55℃~+155℃; ComponentLink1Description: Datasheet; ComponentLink1URL: https://wmsc.lcsc.com/wmsc/upload/file/pdf/v2/lcsc/2205312030_UNI-ROYAL-Uniroyal-Elec-0201WMF4022TEE_C423536.pdf; ComponentLink2Description: JLCPCB Part URL; ComponentLink2URL: https://jlcpcb.com/partdetail/C423536
pins: 1, 2
1 alternate drawing of the same symbol

## 0201WMF4023TEE
designator R?  Resistance: 402kΩ  (hidden comment: *)
Resistor, 402kΩ, ±1%, 50mW, 25V, ±200ppm/℃, -55℃~+155℃, SMD 0201; Manufacturer: Uniroyal; Manufacturer Part Number: 0201WMF4023TEE; Supplier 1: LCSC; Supplier Part Number 1: C423535; JLCPCB Part Number: C423535; Power Rating: 50mW; Category: Resistors; Package Size: 0201; JLCPCB Basic Part: Yes; Tolerance: ±1%; Voltage Rating: 25V; Temperature Coefficient: ±200ppm/℃; Temperature Rating: -55℃~+155℃; ComponentLink1Description: Datasheet; ComponentLink1URL: https://wmsc.lcsc.com/wmsc/upload/file/pdf/v2/lcsc/2205312030_UNI-ROYAL-Uniroyal-Elec-0201WMF4023TEE_C423535.pdf; ComponentLink2Description: JLCPCB Part URL; ComponentLink2URL: https://jlcpcb.com/partdetail/C423535
pins: 1, 2
1 alternate drawing of the same symbol

## 0201WMF4120TEE
designator R?  Resistance: 412Ω  (hidden comment: *)
Resistor, 412Ω, ±1%, 50mW, 25V, ±200ppm/℃, -55℃~+155℃, SMD 0201; Manufacturer: Uniroyal; Manufacturer Part Number: 0201WMF4120TEE; Supplier 1: LCSC; Supplier Part Number 1: C423532; JLCPCB Part Number: C423532; Power Rating: 50mW; Category: Resistors; Package Size: 0201; JLCPCB Basic Part: Yes; Tolerance: ±1%; Voltage Rating: 25V; Temperature Coefficient: ±200ppm/℃; Temperature Rating: -55℃~+155℃; ComponentLink1Description: Datasheet; ComponentLink1URL: https://wmsc.lcsc.com/wmsc/upload/file/pdf/v2/lcsc/2205312145_UNI-ROYAL-Uniroyal-Elec-0201WMF4120TEE_C423532.pdf; ComponentLink2Description: JLCPCB Part URL; ComponentLink2URL: https://jlcpcb.com/partdetail/C423532
pins: 1, 2
1 alternate drawing of the same symbol

## 0201WMF4121TEE
designator R?  Resistance: 4.12kΩ  (hidden comment: *)
Resistor, 4.12kΩ, ±1%, 50mW, 25V, ±200ppm/℃, -55℃~+155℃, SMD 0201; Manufacturer: Uniroyal; Manufacturer Part Number: 0201WMF4121TEE; Supplier 1: LCSC; Supplier Part Number 1: C2691504; JLCPCB Part Number: C2691504; Power Rating: 50mW; Category: Resistors; Package Size: 0201; JLCPCB Basic Part: Yes; Tolerance: ±1%; Voltage Rating: 25V; Temperature Coefficient: ±200ppm/℃; Temperature Rating: -55℃~+155℃; ComponentLink1Description: Datasheet; ComponentLink1URL: https://wmsc.lcsc.com/wmsc/upload/file/pdf/v2/lcsc/2206011045_UNI-ROYAL-Uniroyal-Elec-0201WMF4121TEE_C2691504.pdf; ComponentLink2Description: JLCPCB Part URL; ComponentLink2URL: https://jlcpcb.com/partdetail/C2691504
pins: 1, 2
1 alternate drawing of the same symbol

## 0201WMF4221TEE
designator R?  Resistance: 4.22kΩ  (hidden comment: *)
Resistor, 4.22kΩ, ±1%, 50mW, 25V, ±200ppm/℃, -55℃~+155℃, SMD 0201; Manufacturer: Uniroyal; Manufacturer Part Number: 0201WMF4221TEE; Supplier 1: LCSC; Supplier Part Number 1: C423529; JLCPCB Part Number: C423529; Power Rating: 50mW; Category: Resistors; Package Size: 0201; JLCPCB Basic Part: Yes; Tolerance: ±1%; Voltage Rating: 25V; Temperature Coefficient: ±200ppm/℃; Temperature Rating: -55℃~+155℃; ComponentLink1Description: Datasheet; ComponentLink1URL: https://wmsc.lcsc.com/wmsc/upload/file/pdf/v2/lcsc/2205312145_UNI-ROYAL-Uniroyal-Elec-0201WMF4221TEE_C423529.pdf; ComponentLink2Description: JLCPCB Part URL; ComponentLink2URL: https://jlcpcb.com/partdetail/C423529
pins: 1, 2
1 alternate drawing of the same symbol

## 0201WMF4222TEE
designator R?  Resistance: 42.2kΩ  (hidden comment: *)
Resistor, 42.2kΩ, ±1%, 50mW, 25V, ±200ppm/℃, -55℃~+155℃, SMD 0201; Manufacturer: Uniroyal; Manufacturer Part Number: 0201WMF4222TEE; Supplier 1: LCSC; Supplier Part Number 1: C474281; JLCPCB Part Number: C474281; Power Rating: 50mW; Category: Resistors; Package Size: 0201; JLCPCB Basic Part: Yes; Tolerance: ±1%; Voltage Rating: 25V; Temperature Coefficient: ±200ppm/℃; Temperature Rating: -55℃~+155℃; ComponentLink1Description: Datasheet; ComponentLink1URL: https://wmsc.lcsc.com/wmsc/upload/file/pdf/v2/lcsc/2205312045_UNI-ROYAL-Uniroyal-Elec-0201WMF4222TEE_C474281.pdf; ComponentLink2Description: JLCPCB Part URL; ComponentLink2URL: https://jlcpcb.com/partdetail/C474281
pins: 1, 2
1 alternate drawing of the same symbol

## 0201WMF4301TEE
designator R?  Resistance: 4.3kΩ  (hidden comment: *)
Resistor, 4.3kΩ, ±1%, 50mW, 25V, ±200ppm/℃, -55℃~+155℃, SMD 0201; Manufacturer: Uniroyal; Manufacturer Part Number: 0201WMF4301TEE; Supplier 1: LCSC; Supplier Part Number 1: C423525; JLCPCB Part Number: C423525; Power Rating: 50mW; Category: Resistors; Package Size: 0201; JLCPCB Basic Part: Yes; Tolerance: ±1%; Voltage Rating: 25V; Temperature Coefficient: ±200ppm/℃; Temperature Rating: -55℃~+155℃; ComponentLink1Description: Datasheet; ComponentLink1URL: https://wmsc.lcsc.com/wmsc/upload/file/pdf/v2/lcsc/2205312145_UNI-ROYAL-Uniroyal-Elec-0201WMF4301TEE_C423525.pdf; ComponentLink2Description: JLCPCB Part URL; ComponentLink2URL: https://jlcpcb.com/partdetail/C423525
pins: 1, 2
1 alternate drawing of the same symbol

## 0201WMF4302TEE
designator R?  Resistance: 43kΩ  (hidden comment: *)
Resistor, 43kΩ, ±1%, 50mW, 25V, ±200ppm/℃, -55℃~+155℃, SMD 0201; Manufacturer: Uniroyal; Manufacturer Part Number: 0201WMF4302TEE; Supplier 1: LCSC; Supplier Part Number 1: C473463; JLCPCB Part Number: C473463; Power Rating: 50mW; Category: Resistors; Package Size: 0201; JLCPCB Basic Part: Yes; Tolerance: ±1%; Voltage Rating: 25V; Temperature Coefficient: ±200ppm/℃; Temperature Rating: -55℃~+155℃; ComponentLink1Description: Datasheet; ComponentLink1URL: https://wmsc.lcsc.com/wmsc/upload/file/pdf/v2/lcsc/2205312145_UNI-ROYAL-Uniroyal-Elec-0201WMF4302TEE_C473463.pdf; ComponentLink2Description: JLCPCB Part URL; ComponentLink2URL: https://jlcpcb.com/partdetail/C473463
pins: 1, 2
1 alternate drawing of the same symbol

## 0201WMF4322TEE
designator R?  Resistance: 43.2kΩ  (hidden comment: *)
Resistor, 43.2kΩ, ±1%, 50mW, 25V, ±200ppm/℃, -55℃~+155℃, SMD 0201; Manufacturer: Uniroyal; Manufacturer Part Number: 0201WMF4322TEE; Supplier 1: LCSC; Supplier Part Number 1: C423521; JLCPCB Part Number: C423521; Power Rating: 50mW; Category: Resistors; Package Size: 0201; JLCPCB Basic Part: Yes; Tolerance: ±1%; Voltage Rating: 25V; Temperature Coefficient: ±200ppm/℃; Temperature Rating: -55℃~+155℃; ComponentLink1Description: Datasheet; ComponentLink1URL: https://wmsc.lcsc.com/wmsc/upload/file/pdf/v2/lcsc/2205312145_UNI-ROYAL-Uniroyal-Elec-0201WMF4322TEE_C423521.pdf; ComponentLink2Description: JLCPCB Part URL; ComponentLink2URL: https://jlcpcb.com/partdetail/C423521
pins: 1, 2
1 alternate drawing of the same symbol